# Altium footprint library connector.PcbLib: 207 footprints (part 4 of 13)
Each footprint in its own frame and in the unit in brackets; x right, y up, seen from the top. Pads: shape width x height; smd on the part's side, far side on the other; paste and mask are expansions set on the pad; w line width, h text height; cw(c..) or ccw(c..) is an arc to the next point about the centre after c.
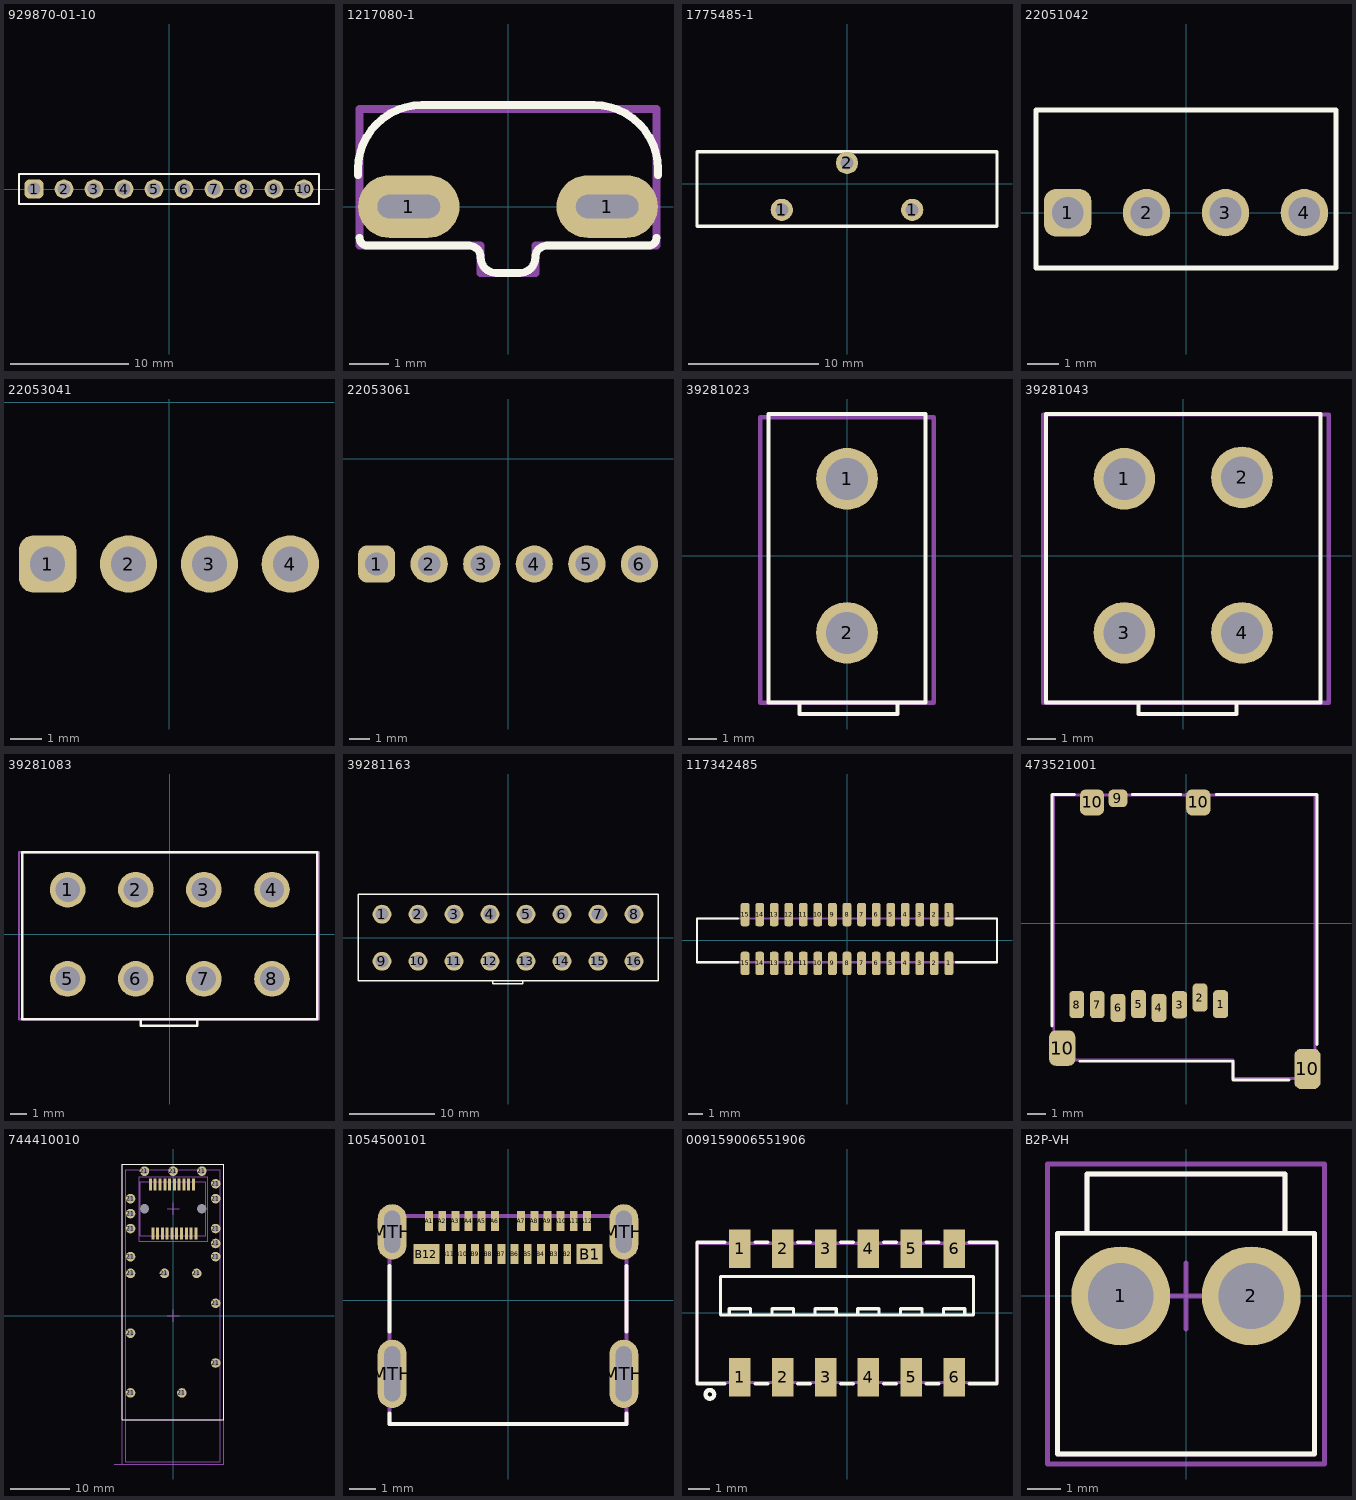
[diagram p3: the footprints below, top view; thin cyan lines are the x and y axes]

## 929870-01-10 [mm]
height 3.81
pads (10):
  rrect50% 1.6x1.6 hole 1.1: 1(-11.43,0)
  round 1.6 hole 1.1: 2(-8.89,0) 3(-6.35,0) 4(-3.81,0) 5(-1.27,0) 6(1.27,0) 7(3.81,0) 8(6.35,0) 9(8.89,0) 10(11.43,0)
Top Overlay:
  lines w0.15: -12.7,-1.27 -12.7,1.27 12.7,1.27 12.7,-1.27 -12.7,-1.27
3D body: height 3.81, standoff 0, extent -12.7,-1.27 12.7,1.27

## 1217080-1 [mm]
pads (2):
  oval 2.6x1.6 hole 0.6 slot 1.6 at 0 deg: 1(-2.54,0) 1(2.54,0)
Top Overlay:
  lines w0.2: -3.84,0.8 -3.84,0.96 cw(c-2.2,0.96) -2.2,2.6 0.1,2.6 ; -3.8,-0.8 ccw(c-3.6,-0.8) -3.6,-1 -1.24,-1 -1,-1 cw(c-1,-1.3) -0.7,-1.3 ccw(c-0.3,-1.3) -0.3,-1.7 0,-1.7 0.3,-1.7 ccw(c0.3,-1.3) 0.7,-1.3 cw(c1,-1.3) 1,-1 1.24,-1 3.6,-1 ccw(c3.6,-0.8) 3.8,-0.8 ; -0.1,2.6 2.2,2.6 cw(c2.2,0.96) 3.84,0.96 3.84,0.8
Top Courtyard:
  lines w0.2: -3.8,-1 -0.7,-1 -0.7,-1.7 0,-1.7 0.7,-1.7 0.7,-1 3.8,-1 3.8,2.5 0,2.5 -3.8,2.5 -3.8,-1
3D body "1217080-1.stp": height 9.91, standoff -3.81, extent -3.699,-1.675 3.794,2.567

## 1775485-1 [mm]
height 18.5
pads (3):
  round 1.7 hole 1: 1(-5,-2) 1(5,-2) 2(0,1.6)
Top Overlay:
  lines w0.254: -11.5,-3.25 -0.25,-3.25 11.5,-3.25 11.5,0 11.5,2.45 0.55,2.45 -11.5,2.45 -11.5,0 -11.5,-3.25
3D body "User Library-TE_2-1775485-1_CR2032_bat_vert_holder.step": height 18.5, standoff -4, extent -11.5,-3.35 11.5,2.45

## 22051042 [mm]
height 6.3
pads (4):
  rrect50% 1.5x1.5 hole 1: 1(-3.75,0)
  round 1.5 hole 1: 2(-1.25,0) 3(1.25,0) 4(3.75,0)
Top Overlay:
  lines w0.15: -4.75,-1.75 4.75,-1.75 4.75,3.25 4.5,3.25 -4.75,3.25 -4.75,0 -4.75,-1.75
3D body "022051042.stp": height 6.47, standoff -3.25, extent -4.75,-10.1 4.75,3.2

## 22053041 [mm] "KK 254 Solid Header, Right-Angle"
pads (4):
  rrect50% 1.8x1.8 hole 1.1: 1(-3.81,-5.08)
  round 1.8 hole 1.1: 2(-1.27,-5.08) 3(1.27,-5.08) 4(3.81,-5.08)
3D body "022053041.stp": height 6.48, standoff -3.46, extent -5.004,-5.386 5.004,7.543

## 22053061 [mm] "KK 254 Solid Header, Right-Angle"
pads (6):
  rrect50% 1.8x1.8 hole 1.1: 1(-6.35,-5.08)
  round 1.8 hole 1.1: 2(-3.81,-5.08) 3(-1.27,-5.08) 4(1.27,-5.08) 5(3.81,-5.08) 6(6.35,-5.08)
3D body "022053061.stp": height 6.48, standoff -3.46, extent -7.544,-5.386 7.544,7.543

## 39281023 [mm] "Mini-Fit Jr.пїЅ Header, Dual Row, Right Angle, with Snap-in Plastic Peg PCB Lock, 4 Circuits, PA Polyamide Nylon 6/6 94V-2, Tin (Sn) Plating"
height 9.6
pads (2):
  round 2.2 hole 1.5: 1(0,2.75) 2(0,-2.75)
Top Overlay:
  lines w0.15: -1.7,-5.25 -1.7,-5.65 1.8,-5.65 1.8,-5.25 ; -2.8,-5.237 -2.8,5.063 2.8,5.063 2.8,-5.237 -2.8,-5.237
Top Courtyard:
  lines w0.15: -3.1,-5.25 -3.1,4.95 3.1,4.95 3.1,-5.25 -3.1,-5.25
3D body "39281023.stp": height 12.8, standoff -3.5, extent -3.1,-6.05 3.1,4.95

## 39281043 [mm] "Mini-Fit Jr.пїЅ Header, Dual Row, Right Angle, with Snap-in Plastic Peg PCB Lock, 4 Circuits, PA Polyamide Nylon 6/6 94V-2, Tin (Sn) Plating"
height 9.6
pads (4):
  round 2.2 hole 1.5: 1(-2.1,2.75) 2(2.1,2.8) 3(-2.1,-2.75) 4(2.1,-2.75)
Top Overlay:
  lines w0.15: -1.6,-5.25 -1.6,-5.65 1.9,-5.65 1.9,-5.25 ; -0.7,-5.237 4.9,-5.237 4.9,5.063 -0.7,5.063 ; 0.7,-5.237 -4.9,-5.237 -4.9,5.063 0.7,5.063
Top Courtyard:
  lines w0.15: -5,-5.25 0.1,-5.25 5.2,-5.25 5.2,5.05 -5,5.05 -5,-5.25
3D body "39281043.stp": height 12.8, standoff -3.5, extent -5.1,-5.85 5.3,5.15

## 39281083 [mm] "Mini-Fit Jr.пїЅ Header, Dual Row, Right Angle, with Snap-in Plastic Peg PCB Lock, 4 Circuits, PA Polyamide Nylon 6/6 94V-2, Tin (Sn) Plating"
height 9.6
pads (8):
  round 2.2 hole 1.5: 1(-6.3,2.75) 2(-2.1,2.75) 3(2.1,2.75) 4(6.3,2.75) 5(-6.3,-2.75) 6(-2.1,-2.75) 7(2.1,-2.75) 8(6.3,-2.75)
Top Overlay:
  lines w0.15: -1.8,-5.25 -1.8,-5.65 1.7,-5.65 1.7,-5.25 ; -9.1,-5.237 3.5,-5.237 9.1,-5.237 9.1,5.063 -3.5,5.063 -9.1,5.063 -9.1,-5.237
Top Courtyard:
  lines w0.15: -9.3,-5.25 -4.1,-5.25 9.2,-5.25 9.2,5.05 -9.3,5.05 -9.3,-5.25
3D body "39281083.stp": height 12.8, standoff -3.5, extent -9.4,-5.95 9.4,5.05

## 39281163 [mm] "Mini-Fit Jr.пїЅ Header, Dual Row, Right Angle, with Snap-in Plastic Peg PCB Lock, 16 Circuits, PA Polyamide Nylon 6/6 94V-2, Tin (Sn) Plating"
height 9.6
pads (16):
  round 2.2 hole 1.5: 1(-14.7,2.75) 2(-10.5,2.75) 3(-6.3,2.75) 4(-2.1,2.75) 5(2.1,2.75) 6(6.3,2.75) 7(10.5,2.75) 8(14.7,2.75) 9(-14.7,-2.75) 10(-10.5,-2.75) 11(-6.3,-2.75) 12(-2.1,-2.75) 13(2.1,-2.75) 14(6.3,-2.75) 15(10.5,-2.75) 16(14.7,-2.75)
Top Overlay:
  lines w0.15: -17.5,5.063 -17.5,-5.022 3.259,-4.996 17.5,-4.996 17.5,5.063 -3.5,5.063 -17.5,5.1 ; -1.764,-5 -1.764,-5.4 1.736,-5.4 1.736,-5
3D body "039281163.stp": height 12.8, standoff -3.5, extent -17.8,-6 17.8,5

## 117342485 [mm]
pads (30):
  rrect50% 0.6x1.6 smd mask+0.05: 1(7,-1.575) 1(7,1.775) 2(6,-1.575) 2(6,1.775) 3(5,-1.575) 3(5,1.775) 4(4,-1.575) 4(4,1.775) 5(3,-1.575) 5(3,1.775) 6(2,-1.575) 6(2,1.775) 7(1,-1.575) 7(1,1.775) 8(0,-1.575) 8(0,1.775) 9(-1,-1.575) 9(-1,1.775) 10(-2,-1.575) 10(-2,1.775) 11(-3,-1.575) 11(-3,1.775) 12(-4,-1.575) 12(-4,1.775) 13(-5,-1.575) 13(-5,1.775) 14(-6,-1.575) 14(-6,1.775) 15(-7,-1.575) 15(-7,1.775)
Top Overlay:
  lines w0.15: -7.5,-1.5 -10.3,-1.5 -10.3,0 -10.3,1.5 -7.5,1.5 ; 7.5,-1.5 10.3,-1.5 10.3,0 10.3,1.5 7.5,1.5
  text "." at 7.9,2 h0.1
Top Courtyard:
  lines w0.15: -10.3,-1.5 -10.3,1.5 10.3,1.5 10.3,-1.5 -10.3,-1.5
3D body "1-1734248-5--3DModel-STEP-56544.STEP": height 7.7, standoff 0, extent -11.2,-2.425 11.2,2.425

## 473521001 [mm]
pads (13):
  rrect50% 0.8x1.5 smd: 1(1.831,-4.34) 2(0.727,-3.985) 4(-1.473,-4.538) 5(-2.567,-4.333) 6(-3.665,-4.534)
  rrect50% 0.8x1.45 smd: 3(-0.368,-4.367) 7(-4.779,-4.36) 8(-5.876,-4.356)
  rrect50% 1x0.95 smd: 9(-3.667,6.693)
  rrect50% 1.4x1.9 smd: 10(-6.656,-6.688)
  rrect50% 1.3x1.4 smd: 10(-5.059,6.475) 10(0.64,6.471)
  rrect50% 1.4x2.15 smd: 10(6.485,-7.808)
Top Overlay:
  lines w0.15: -7.2,-5.5 -7.2,6.9 -6,6.9 ; -5.7,-7.4 2.5,-7.4 2.5,-8.4 5.5,-8.4 ; -2.9,6.9 -0.3,6.9 ; 1.6,6.9 7,6.9 7,-6.5
Top Courtyard:
  lines w0.15: -7.11,-7.326 -7.11,6.875 6.892,6.875 6.892,-8.325 2.5,-8.325 2.5,-7.326 -7.11,-7.326
3D body "473521001.stp": height 1.95, standoff 0.07, extent -7.157,-8.273 6.943,6.927

## 744410010 [mm] "SFP connector"
pads (42):
  rect 0.5x2 smd: 1(-3.4,13.8) 2(-2.6,13.8) 3(-1.8,13.8) 4(-1,13.8) 5(-0.2,13.8) 6(0.6,13.8) 7(1.4,13.8) 8(2.2,13.8) 9(3,13.8) 10(3.8,13.8) 11(3.4,22) 12(2.6,22) 13(1.8,22) 14(1,22) 15(0.2,22) 16(-0.6,22) 17(-1.4,22) 18(-2.2,22) 19(-3,22) 20(-3.8,22)
  round 1.6 hole 0.95: 21(-7.13,-12.9) 21(-7.13,-2.9) 21(-7.13,7.1) 21(-7.13,9.9) 21(-7.13,14.6) 21(-7.13,17.1) 21(-7.13,19.6) 21(-4.8,24.2) 21(-1.45,7.1) 21(0,24.2) 21(1.45,-12.9) 21(3.95,7.1) 21(4.8,24.2) 21(7.12,-7.9) 21(7.12,2.1) 21(7.12,9.9) 21(7.12,12.1) 21(7.12,14.6) 21(7.12,19.6) 21(7.12,22.1)
  round 0 hole 1.55: ""(-4.8,17.9) ""(4.8,17.9)
Top Overlay:
  lines w0.2: -8.5,-17.4 8.5,-17.4 8.5,25.4 -8.5,25.4 -8.5,-17.4
Mechanical 13:
  lines w0.2: -7.918,-17.4 7.9,-17.4 ; -7.918,-24.4 7.918,-24.4 7.918,24.4 -7.918,24.4 -7.918,-24.4 ; -5.5,13.4 5.5,13.4 5.5,22.4 -5.5,22.4 -5.5,13.4
Mechanical 15:
  lines w0.1: -9.88,-24.8 -8.5,-24.8 ; -1,0 1,0 ; -1,17.9 1,17.9 ; 0,-1 0,1 ; 0,16.9 0,18.9 ; -8.5,-24.8 -8.5,25.4 ; -8.5,-24.8 -7.9,-24.8 7.12,-24.8 8.5,-24.8 8.5,25.4 -8.5,25.4 ; -8.5,-24.8 -8.5,25.4 ; -5.7,12.5 -5.7,13 -5.7,23.3 5.8,23.3 5.8,12.5 -5.7,12.5
3D body "c-1367073-2-f-3d.stp": height 5.2, standoff -0.8, extent -5.5,13.4 5.5,22.4
3D body "c-1489669-1-c2-3d.stp": height 10.37, standoff -3.01, extent -7.918,-24.4 7.918,24.4

## 1054500101 [mm]
height 3.3
pads (28):
  rect 0.3x0.76 smd: A1(-3,3) A2(-2.5,3) A3(-2,3) A4(-1.5,3) A5(-1,3) A6(-0.5,3) A7(0.5,3) A8(1,3) A9(1.5,3) A10(2,3) A11(2.5,3) A12(3,3) B2(2.25,1.75) B3(1.75,1.75) B4(1.25,1.75) B5(0.75,1.75) B6(0.25,1.75) B7(-0.25,1.75) B8(-0.75,1.75) B9(-1.25,1.75) B10(-1.75,1.75) B11(-2.25,1.75)
  rect 1x0.76 smd: B1(3.1,1.75) B12(-3.1,1.75)
  oval 1.1x2.6 hole 0.6 slot 2.1 at 90 deg: MTH(-4.4,-2.8) MTH(4.4,-2.8)
  oval 1.1x2.1 hole 0.6 slot 1.6 at 90 deg: MTH(-4.4,2.6) MTH(4.4,2.6)
Top Overlay:
  lines w0.15: -4.5,-4.3 -4.5,-4.7 0,-4.7 4.5,-4.7 4.5,-4.3 ; -4.5,-1.2 -4.5,1.3 ; 4.5,-1.2 4.5,1.3
Top Courtyard:
  lines w0.15: -4.5,-4.7 4.5,-4.7 4.5,3.2 -4.5,3.2 -4.5,-4.7
3D body "1054500101.stp": height 3.18, standoff -0.78, extent -4.47,-4.7 4.47,3.2

## 009159006551906 [mm]
height 5
pads (12):
  rect 1x1.8 smd: 1(-5,-3) 1(-5,3) 2(-3,-3) 2(-3,3) 3(-1,-3) 3(-1,3) 4(1,-3) 4(1,3) 5(3,-3) 5(3,3) 6(5,-3) 6(5,3)
Top Overlay:
  circle w0.2: c-6.4,-3.8 r0.2
  lines w0.15: -5.7,-3.3 -7,-3.3 -7,0.1 -7,3.3 -5.7,3.3 ; -5.487,-0.1 -5.5,-0.1 -5.5,0.2 -4.5,0.2 -4.5,-0.1 ; -4.3,-3.3 -3.7,-3.3 ; -4.3,3.3 -3.7,3.3 ; -3.5,-0.1 -3.5,0.2 -2.5,0.2 -2.5,-0.1 ; -2.3,-3.3 -1.7,-3.3 ; -2.3,3.3 -1.7,3.3 ; -1.5,-0.1 -1.5,0.2 -0.5,0.2 -0.5,-0.1 ; -0.3,-3.3 0.3,-3.3 ; -0.3,3.3 0.3,3.3 ; 0.5,-0.1 0.5,0.2 1.5,0.2 1.5,-0.1 ; 1.7,-3.3 2.3,-3.3 ; 1.7,3.3 2.3,3.3 ; 2.5,-0.1 2.5,0.2 3.5,0.2 3.5,-0.1 ; 3.7,-3.3 4.3,-3.3 ; 3.7,3.3 4.3,3.3 ; 4.5,-0.1 4.5,0.2 5.5,0.2 5.5,-0.1 ; 5.7,-3.3 7,-3.3 7,0.1 7,3.3 5.7,3.3 ; -5.9,-0.1 -5.9,1.7 0,1.7 5.9,1.7 5.9,-0.1 -0.2,-0.1 -5.9,-0.1
Top Courtyard:
  lines w0.15: -7,-3.25 -7,3.25 7,3.25 7,-3.25 -7,-3.25
3D body "AVX-00-9159-006-551-906.STEP": height 5.1, standoff 0.05, extent -7,-3.75 7,3.75

## B2P-VH [mm]
height 11
pads (2):
  round 3 hole 2: 1(-1.98,0) 2(1.98,0)
Top Overlay:
  lines w0.15: -3,1.9 -3,3.7 3,3.7 3,1.9 ; -3.9,1.9 3.9,1.9 ; -3.9,1.9 -3.9,-4.8 3.9,-4.8 3.9,1.9 ; -3.9,1.9 3.9,1.9
Mechanical 15:
  lines w0.15: -1,0 1,0 ; 0,-1 0,1 ; -4.2,-5.1 4.2,-5.1 4.2,4 -4.2,4 -4.2,-5.1
Mechanical 29:
  lines w0.15: -3,1.9 -3,3.7 3,3.7 3,1.9 ; -3.9,1.9 3.9,1.9 ; -3.9,1.9 -3.9,-4.8 3.9,-4.8 3.9,1.9 ; -3.9,1.9 3.9,1.9
  text ".Designator" at -3,-1.8 h1
3D body "B2P-VH-BK.STEP": height 10.9, standoff -3.7, extent -3.93,-4.65 3.93,3.85